# Altium footprint library FOOTPRINT.PcbLib: 132 footprints (part 9 of 9)
Each footprint in its own frame and in the unit in brackets; x right, y up, seen from the top. Pads: shape width x height; smd on the part's side, far side on the other; paste and mask are expansions set on the pad; w line width, h text height; cw(c..) or ccw(c..) is an arc to the next point about the centre after c.
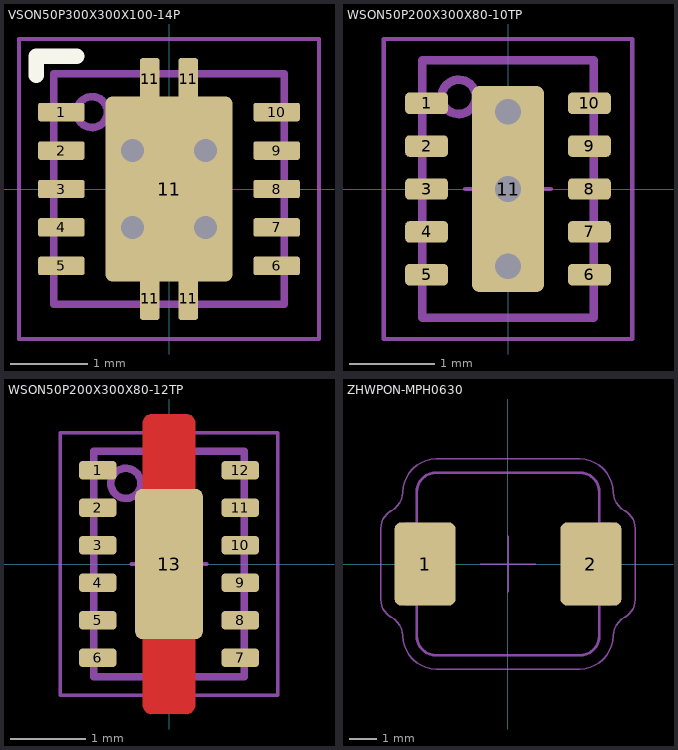
[diagram p8: the footprints below, top view; thin cyan lines are the x and y axes]

## VSON50P300X300X100-14P [mm] "VSON14, 15-Leads, Thermal Pad, Body 3.0x4.0mm"
height 1
pads (15):
  rrect20% 0.6x0.24 smd paste+0: 1(-1.4,1) 2(-1.4,0.5) 3(-1.4,0) 4(-1.4,-0.5) 5(-1.4,-1) 6(1.4,-1) 7(1.4,-0.5) 8(1.4,0) 9(1.4,0.5) 10(1.4,1)
  rrect20% 0.25x0.55 smd paste-100: 11(-0.25,-1.425) 11(-0.25,1.425) 11(0.25,-1.425) 11(0.25,1.425)
  rrect10% 1.65x2.4 smd paste-100: 11(0,0)
via -0.475,-0.5 diameter 0.6 hole 0.3
via 0.475,-0.5 diameter 0.6 hole 0.3
via 0.475,0.5 diameter 0.6 hole 0.3
via -0.475,0.5 diameter 0.6 hole 0.3
Top Overlay:
  lines w0.2: -1.725,1.475 -1.725,1.725 -1.2,1.725
Top Paste:
  drawing of 7 lines, arcs and shapes, not listed
Top Assembly:
  circle w0.1: c-1,1 r0.2
  lines w0.1: -1.5,-1.5 -1.5,1.5 1.5,1.5 1.5,-1.5 -1.5,-1.5
Top Courtyard:
  lines w0.05: -1.95,-1.95 -1.95,1.95 1.95,1.95 1.95,-1.95 -1.95,-1.95
Top Component Center:
  lines w0.05: -0.5,0 0.5,0 ; 0,-0.5 0,0.5
Top Designator:
  text "'.Comment'" at 0.81,-1.375 h0.65
  text "'.Designator'" at -0.351,-1.375 h0.65
3D body "VSON50P300X300X100-14TP.x_t": height 1.01, standoff 0.01, extent -1.51,-1.51 1.51,1.51

## WSON50P200X300X80-10TP [mm] "WSON10, 11 Leads, Thermal Pad, Body 2.0x3.0mm"
height 0.8
pads (11):
  rrect40% 0.5x0.25 smd paste+0: 1(-0.95,1) 2(-0.95,0.5) 3(-0.95,0) 4(-0.95,-0.5) 5(-0.95,-1) 6(0.95,-1) 7(0.95,-0.5) 8(0.95,0) 9(0.95,0.5) 10(0.95,1)
  rrect20% 0.84x2.4 smd paste-5: 11(0,0)
via 0,-0.9 diameter 0.6 hole 0.3
via 0,0 diameter 0.6 hole 0.3
via 0,0.9 diameter 0.6 hole 0.3
Top Paste:
  region: -0.25,0.2 -0.27,0.2 -0.307,0.215 -0.335,0.243 -0.35,0.28 -0.35,0.3 -0.35,0.6 -0.35,0.62 -0.335,0.657 -0.307,0.685 -0.27,0.7 -0.25,0.7 0.25,0.7 0.27,0.7 0.307,0.685 0.335,0.657 0.35,0.62 0.35,0.6 0.35,0.3 0.35,0.28 0.335,0.243 0.307,0.215 0.27,0.2 0.25,0.2
  region: 0.25,-0.2 0.27,-0.2 0.307,-0.215 0.335,-0.243 0.35,-0.28 0.35,-0.3 0.35,-0.6 0.35,-0.62 0.335,-0.657 0.307,-0.685 0.27,-0.7 0.25,-0.7 -0.25,-0.7 -0.27,-0.7 -0.307,-0.685 -0.335,-0.657 -0.35,-0.62 -0.35,-0.6 -0.35,-0.3 -0.35,-0.28 -0.335,-0.243 -0.307,-0.215 -0.27,-0.2 -0.25,-0.2
Top Assembly:
  circle w0.1: c-0.575,1.075 r0.2
  lines w0.1: -1,-1.5 -1,1.5 1,1.5 1,-1.5 -1,-1.5
Top Courtyard:
  lines w0.05: -1.45,-1.75 1.45,-1.75 1.45,1.75 -1.45,1.75 -1.45,-1.75
Top Component Center:
  lines w0.05: -0.5,0 0.5,0 ; 0,-0.5 0,0.5
Top Designator:
  text "'.Comment'" at 0.635,-1.425 h0.65
  text "'.Designator'" at -0.226,-1.425 h0.65

## WSON50P200X300X80-12TP [mm] "WSON12, 13 Leads, Thermal Pad, Body 2.0x3.0mm"
height 0.8
pads (13):
  rrect40% 0.5x0.25 smd paste+0: 1(-0.95,1.25) 2(-0.95,0.75) 3(-0.95,0.25) 4(-0.95,-0.25) 5(-0.95,-0.75) 6(-0.95,-1.25) 7(0.95,-1.25) 8(0.95,-0.75) 9(0.95,-0.25) 10(0.95,0.25) 11(0.95,0.75) 12(0.95,1.25)
  rrect20% 0.9x2 smd: 13(0,0)
Top:
  region: -0.35,0 -0.35,1.875 -0.35,1.9 -0.331,1.946 -0.296,1.981 -0.25,2 -0.225,2 0.225,2 0.25,2 0.296,1.981 0.331,1.946 0.35,1.9 0.35,1.875 0.35,0
  region: 0.35,0 0.35,-1.875 0.35,-1.9 0.331,-1.946 0.296,-1.981 0.25,-2 0.225,-2 -0.225,-2 -0.25,-2 -0.296,-1.981 -0.331,-1.946 -0.35,-1.9 -0.35,-1.875 -0.35,0
Top Paste:
  region: 0.25,-0.2 0.27,-0.2 0.307,-0.215 0.335,-0.243 0.35,-0.28 0.35,-0.3 0.35,-0.75 0.35,-0.77 0.335,-0.807 0.307,-0.835 0.27,-0.85 0.25,-0.85 -0.25,-0.85 -0.27,-0.85 -0.307,-0.835 -0.335,-0.807 -0.35,-0.77 -0.35,-0.75 -0.35,-0.3 -0.35,-0.28 -0.335,-0.243 -0.307,-0.215 -0.27,-0.2 -0.25,-0.2
  region: -0.25,0.2 -0.27,0.2 -0.307,0.215 -0.335,0.243 -0.35,0.28 -0.35,0.3 -0.35,0.75 -0.35,0.77 -0.335,0.807 -0.307,0.835 -0.27,0.85 -0.25,0.85 0.25,0.85 0.27,0.85 0.307,0.835 0.335,0.807 0.35,0.77 0.35,0.75 0.35,0.3 0.35,0.28 0.335,0.243 0.307,0.215 0.27,0.2 0.25,0.2
Top Assembly:
  circle w0.1: c-0.575,1.075 r0.2
  lines w0.1: -1,-1.5 -1,1.5 1,1.5 1,-1.5 -1,-1.5
Top Courtyard:
  lines w0.05: -1.45,-1.75 1.45,-1.75 1.45,1.75 -1.45,1.75 -1.45,-1.75
Top Component Center:
  lines w0.05: -0.5,0 0.5,0 ; 0,-0.5 0,0.5
Top Designator:
  text "'.Comment'" at 0.635,-1.425 h0.65
  text "'.Designator'" at -0.226,-1.425 h0.65

## ZHWPON-MPH0630 [mm] "Power Inductor for Surface Mounting, Body 6.6x7.4mm"
height 3
pads (2):
  rrect20% 2.2x3 smd: 1(-3,0) 2(3,0)
Top Assembly:
  lines w0.1: -3.3,-1.45 -3.7,-1.45 -3.7,1.45 -3.3,1.45 ; 3.3,-1.45 3.7,-1.45 3.7,1.45 3.3,1.45 ; -3.3,-2.6 ccw(c-2.6,-2.6) -2.6,-3.3 2.6,-3.3 ccw(c2.6,-2.6) 3.3,-2.6 3.3,2.6 ccw(c2.6,2.6) 2.6,3.3 -2.6,3.3 ccw(c-2.6,2.6) -3.3,2.6 -3.3,-2.6
Top Courtyard:
  lines w0.05: -4.6,-1.3 ccw(c-3.9,-1.3) -4.215,-1.925 cw(c-4.612,-2.634) -3.8,-2.6 ccw(c-2.6,-2.6) -2.6,-3.8 2.6,-3.8 ccw(c2.6,-2.6) 3.8,-2.6 cw(c4.612,-2.634) 4.215,-1.925 ccw(c3.9,-1.3) 4.6,-1.3 4.6,1.3 ccw(c3.9,1.3) 4.215,1.925 cw(c4.612,2.634) 3.8,2.6 ccw(c2.6,2.6) 2.6,3.8 -2.6,3.8 ccw(c-2.6,2.6) -3.8,2.6 cw(c-4.612,2.634) -4.215,1.925 ccw(c-3.9,1.3) -4.6,1.3 -4.6,-1.3
Top Component Center:
  lines w0.05: -1,0 1,0 ; 0,-1 0,-1 ; 0,-1 0,1 ; 0,1 0,1
Top Designator:
  text "'.Designator'" at -1.5,0.351 h0.65
  text "'.Comment'" at -1.5,-0.735 h0.65
3D body "ZHWPON-MPH0630.x_t": height 3.01, standoff 0.01, extent -3.7,-3.3 3.7,3.3